# Altium footprint library ElectrolytCapacitors.PcbLib: 25 footprints (part 2 of 2)
Each footprint in its own frame and in the unit in brackets; x right, y up, seen from the top. Pads: shape width x height; smd on the part's side, far side on the other; paste and mask are expansions set on the pad; w line width, h text height; cw(c..) or ccw(c..) is an arc to the next point about the centre after c.
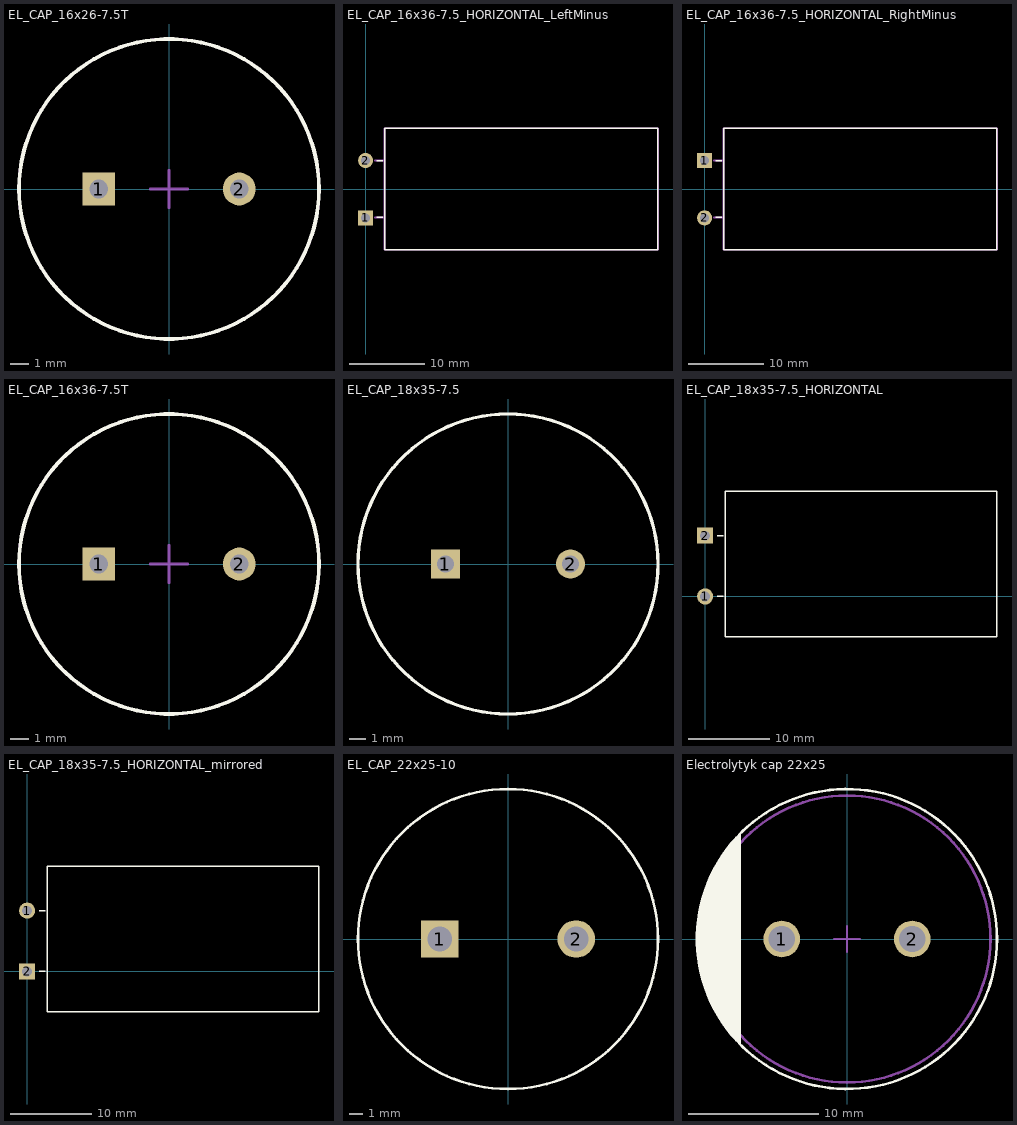
[diagram p1: the footprints below, top view; thin cyan lines are the x and y axes]

## EL_CAP_16x26-7.5T [mm]
height 26
pads (2):
  rect 1.75x1.75 hole 1: 1(-3.75,0)
  round 1.75 hole 1: 2(3.75,0)
Top Overlay:
  circle w0.2: c0,0 r8
Mechanical 15:
  circle w0.15: c0,0 r8
  lines w0.15: -1,0 1,0 ; 0,-1 0,1
3D body "User Library-Cap-EL(16x26-7_5)T.STEP": height 26, standoff -2, extent -8,-7.997 8.002,7.997

## EL_CAP_16x36-7.5_HORIZONTAL_LeftMinus [mm]
height 16
pads (2):
  rect 2x2 hole 1.2: 1(0,-3.8)
  round 2 hole 1.2: 2(0,3.75)
Top Overlay:
  lines w0.178: 1.5,-3.75 2.25,-3.75 ; 1.5,3.75 2.25,3.75 ; 2.5,-8 38.5,-8 38.5,8 2.5,8 2.5,-8
Mechanical 15:
  lines w0.254: 1.25,-3.75 2.5,-3.75 ; 1.25,3.75 2.5,3.75 ; 2.5,-8 38.5,-8 38.5,8 2.5,8 2.5,-8
3D body "User Library-Cap-EL(16x36-7_5)T_HOR_LM.STEP": height 16, standoff -2.5, extent -0.4,-8 37.5,8.002

## EL_CAP_16x36-7.5_HORIZONTAL_RightMinus [mm]
height 16
pads (2):
  rect 2x2 hole 1.2: 1(0,3.75)
  round 2 hole 1.2: 2(0,-3.8)
Top Overlay:
  lines w0.178: 1.5,-3.75 2.25,-3.75 ; 1.5,3.75 2.25,3.75 ; 2.5,-8 38.5,-8 38.5,8 2.5,8 2.5,-8
Mechanical 15:
  lines w0.254: 1.25,-3.75 2.5,-3.75 ; 1.25,3.75 2.5,3.75 ; 2.5,-8 38.5,-8 38.5,8 2.5,8 2.5,-8
3D body "User Library-Cap-EL(16x36-7_5)T_HOR_RM.STEP": height 16, standoff -2.5, extent -0.4,-8.002 37.5,8

## EL_CAP_16x36-7.5T [mm]
height 36
pads (2):
  rect 1.75x1.75 hole 1: 1(-3.75,0)
  round 1.75 hole 1: 2(3.75,0)
Top Overlay:
  circle w0.2: c0,0 r8
Mechanical 15:
  circle w0.15: c0,0 r8
  lines w0.15: -1,0 1,0 ; 0,-1 0,1
3D body "User Library-Cap-EL(16x36-7_5)T.STEP": height 36, standoff -2, extent -8,-7.997 8.002,8

## EL_CAP_18x35-7.5 [mm]
height 35
pads (2):
  rect 1.75x1.75 hole 1: 1(-3.75,0)
  round 1.75 hole 1: 2(3.75,0)
Top Overlay:
  circle w0.2: c0,0 r9
3D body "User Library-Cap electrolitic radial 18x35.STEP": height 35.3, standoff -1.2, extent -8.987,-8.997 9.007,8.999

## EL_CAP_18x35-7.5_HORIZONTAL [mm]
height 18
pads (2):
  round 2 hole 1.2: 1(0,0)
  rect 2x2 hole 1.2: 2(0,7.5)
Top Overlay:
  lines w0.178: 1.5,0 2.25,0 ; 1.5,7.5 2.25,7.5 ; 2.5,-5 2.5,13 36,13 36,-5 2.5,-5
3D body "User Library-Cap electrolitic radial 18x35.STEP": height 18, standoff 0, extent -0.4,-4.997 36.1,12.997

## EL_CAP_18x35-7.5_HORIZONTAL_mirrored [mm]
height 18
pads (2):
  round 2 hole 1.2: 1(0,7.5)
  rect 2x2 hole 1.2: 2(0,0)
Top Overlay:
  lines w0.178: 1.5,0 2.25,0 ; 1.5,7.5 2.25,7.5 ; 2.5,-5 36,-5 36,13 2.5,13 2.5,-5
3D body "User Library-Cap electrolitic radial 18x35.STEP": height 18, standoff 0, extent -0.4,-4.997 36.1,12.997

## EL_CAP_22x25-10 [mm]
height 25
pads (2):
  rect 2.75x2.75 hole 1.8: 1(-5,0)
  round 2.75 hole 1.8: 2(5,0)
Top Overlay:
  circle w0.2: c0,0 r11
3D body "User Library-ElCap22x25.step": height 25.25, standoff 0.25, extent -11,-11 11,11

## Electrolytyk cap 22x25 [mm]
height 25
pads (2):
  round 2.8 hole 2: 1(-5,0) 2(5,0)
Top Overlay:
  circle w0.2: c0,0 r11.5
  region: -8.2,8 -9.2,7 -9.2,6.9 -9.4,6.7 -9.4,6.5 -9.9,6 -9.9,5.8 -10.2,5.5 -10.2,5.1 -10.5,4.8 -10.5,4.5 -11.1,3.1 -11.5,0.4 -11.3,-2.1 -10.5,-4.7 -9.1,-7.1 -8.2,-8
  lines w0.15: -8.2,-8 -8.2,8
Mechanical 13:
  circle w0.2: c0,0 r11
  lines w0.15: -1,0 1,0 ; 0,-1 0,1
3D body "elh686m400aq1aa.stp": height 27.5, standoff -6.29, extent -16.263,-16.263 16.263,16.263